# Altium footprint library AMDC.PcbLib: 96 footprints (part 1 of 6)
Each footprint in its own frame and in the unit in brackets; x right, y up, seen from the top. Pads: shape width x height; smd on the part's side, far side on the other; paste and mask are expansions set on the pad; w line width, h text height; cw(c..) or ccw(c..) is an arc to the next point about the centre after c.
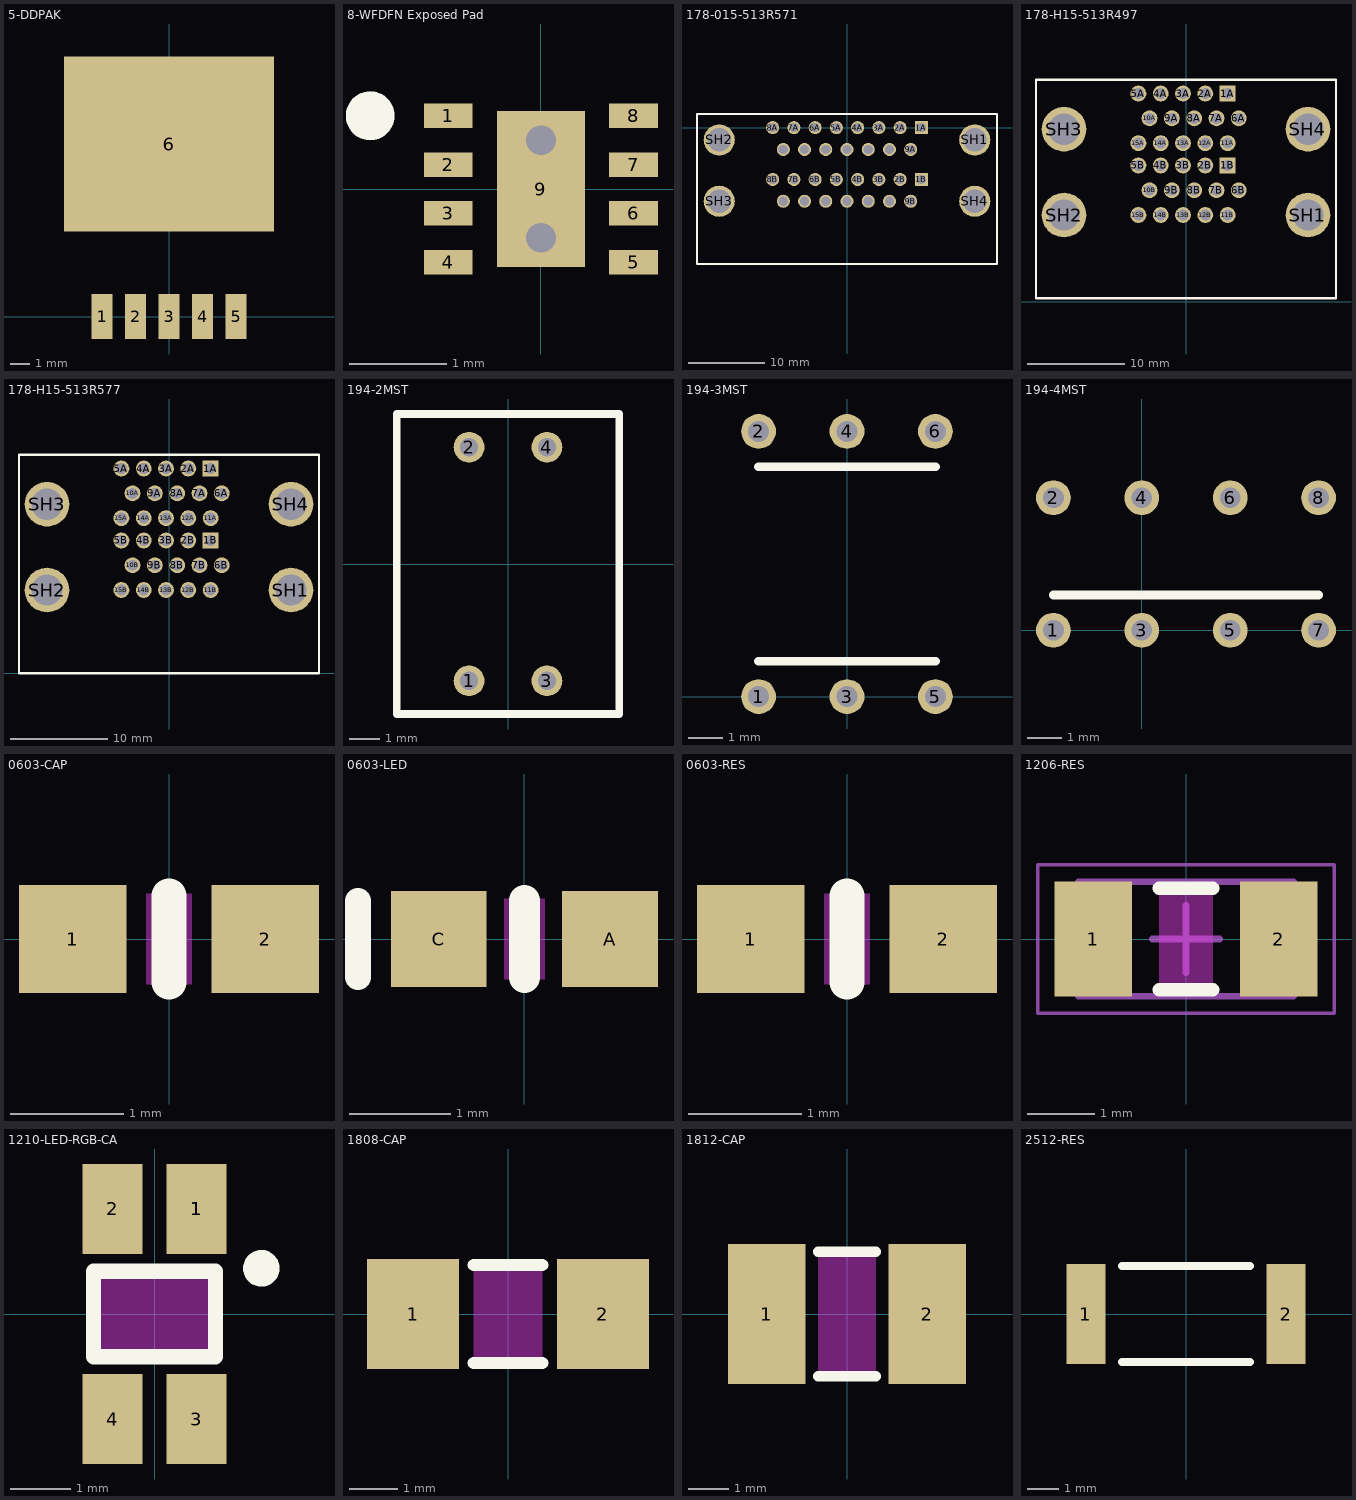
[diagram p0: the footprints below, top view; thin cyan lines are the x and y axes]

## 5-DDPAK [mil] "Q PACKAGE  5-LEAD PLASTIC DD"
height 7.09
pads (6):
  rect 42x90 smd: 1(-134,0) 2(-67,0) 3(0,0) 4(67,0) 5(134,0)
  rect 420x350 smd: 6(0,345)
3D body "TO-263-5.STEP": height 179.53, standoff 0, extent -200,-36.52 200,515.25

## 8-WFDFN Exposed Pad [mm] "8-WSON (2x2)"
pads (9):
  rect 0.5x0.25 smd: 1(-0.95,0.75) 2(-0.95,0.25) 3(-0.95,-0.25) 4(-0.95,-0.75) 5(0.95,-0.75) 6(0.95,-0.25) 7(0.95,0.25) 8(0.95,0.75)
  rect 0.9x1.6 smd: 9(0,0)
via 0,-0.5 diameter 0.559 hole 0.305
via 0,0.5 diameter 0.559 hole 0.305
Top Overlay:
  circle w0.25: c-1.75,0.75 r0.125

## 178-015-513R571 [mil] "CONN D-SUB RCPT 15POS R/A SLDR"
height 1250
pads (34):
  rect 67x67 hole 47: 1A(381.5,0) 1B(381.5,-266)
  round 67 hole 47: 2A(272.5,0) 2B(272.5,-266) 3A(163.5,0) 3B(163.5,-266) 4A(54.5,0) 4B(54.5,-266) 5A(-54.5,0) 5B(-54.5,-266) 6A(-163.5,0) 6B(-163.5,-266) 7A(-272.5,0) 7B(-272.5,-266) 8A(-381.5,0) 8B(-381.5,-266) 9A(327,-112) 9B(327,-378) 10A(218,-112) 10B(218,-378) 11A(109,-112) 11B(109,-378) 12A(0,-112) 12B(0,-378) 13A(-109,-112) 13B(-109,-378) 14A(-218,-112) 14B(-218,-378) 15A(-327,-112) 15B(-327,-378)
  round 160 hole 120: SH1(656,-63) SH2(-656,-63) SH3(-656,-378) SH4(656,-378)
Top Overlay:
  lines w10: -770,-700 770,-700 770,-63 770,30 770,70 -350,70 -500,70 -770,70 -770,-63 -770,-700
3D body "178-015-513.STEP": height 107.38, standoff -1268.62, extent -773.4,-938.49 774.6,62.51

## 178-H15-513R497 [mil] "CONN D-SUB RCPT/RCPT 15/15POS RA"
height 1244.09
pads (34):
  rect 64x64 hole 44: 1A(168,840) 1B(168,550)
  round 64 hole 44: 2A(78,840) 2B(78,550) 3A(-12,840) 3B(-12,550) 4A(-102,840) 4B(-102,550) 5A(-192,840) 5B(-192,550) 6A(213,740) 6B(213,450) 7A(123,740) 7B(123,450) 8A(33,740) 8B(33,450) 9A(-57,740) 9B(-57,450) 10A(-147,740) 10B(-147,450) 11A(168,640) 11B(168,350) 12A(78,640) 12B(78,350) 13A(-12,640) 13B(-12,350) 14A(-102,640) 14B(-102,350) 15A(-192,640) 15B(-192,350)
  round 180 hole 126: SH1(492,350) SH2(-492,350) SH3(-492,696.46) SH4(492,696.46)
Top Overlay:
  lines w10: -605,15 605,15 605,895 -605,895 -605,15
3D body "178-H15-513R497.STEP": height 1248.97, standoff -123.03, extent -608.5,-238 604.5,893

## 178-H15-513R577 [mil] "CONN D-SUB PLUG 15POS R/A SLDR"
height 1244.09
pads (34):
  rect 64x64 hole 44: 1A(168,825) 1B(168,535)
  round 64 hole 44: 2A(78,825) 2B(78,535) 3A(-12,825) 3B(-12,535) 4A(-102,825) 4B(-102,535) 5A(-192,825) 5B(-192,535) 6A(213,725) 6B(213,435) 7A(123,725) 7B(123,435) 8A(33,725) 8B(33,435) 9A(-57,725) 9B(-57,435) 10A(-147,725) 10B(-147,435) 11A(168,625) 11B(168,335) 12A(78,625) 12B(78,335) 13A(-12,625) 13B(-12,335) 14A(-102,625) 14B(-102,335) 15A(-192,625) 15B(-192,335)
  round 180 hole 126: SH1(492,335) SH2(-492,335) SH3(-492,681.46) SH4(492,681.46)
Top Overlay:
  lines w10: -605,0 -605,880 605,880 605,0 -605,0
3D body "178-H15-513R577.STEP": height 1247.05, standoff -142.66, extent -606.49,-244.09 606.5,889.77

## 194-2MST [mm] "SWITCH PIANO DIP SPST 50MA 24V"
pads (4):
  round 1 hole 0.6: 1(-1.27,-3.81) 2(-1.27,3.81) 3(1.27,-3.81) 4(1.27,3.81)
Top Overlay:
  lines w0.254: -1.27,4.89 3.63,4.89 3.63,-4.89 -3.63,-4.89 -3.63,4.89 0,4.89

## 194-3MST [mm] "SWITCH PIANO DIP SPST 50MA 24V"
pads (6):
  round 1 hole 0.6: 1(-2.54,0) 2(-2.54,7.62) 3(0,0) 4(0,7.62) 5(2.54,0) 6(2.54,7.62)
Top Overlay:
  lines w0.254: -2.54,1.016 2.54,1.016 ; -2.54,6.604 2.54,6.604

## 194-4MST [mm] "SWITCH PIANO DIP SPST 50MA 24V"
pads (8):
  round 1 hole 0.6: 1(-2.54,0) 2(-2.54,3.81) 3(0,0) 4(0,3.81) 5(2.54,0) 6(2.54,3.81) 7(5.08,0) 8(5.08,3.81)
Top Overlay:
  lines w0.254: -2.54,1.016 5.08,1.016

## 0603-CAP [mm]
pads (2):
  rect 0.95x0.95 smd: 1(-0.85,0) 2(0.85,0)
Top Layer keep-out:
  region: -0.2,0.4 0.2,0.4 0.2,-0.4 -0.2,-0.4
Top Overlay:
  lines w0.305: 0,-0.381 0,0.381
3D body "0603cap.step": height 0.79, standoff -0.01, extent -0.8,-0.4 0.8,0.4

## 0603-LED [mm]
pads (2):
  rect 0.95x0.95 smd: A(0.85,0) C(-0.85,0)
Top Layer keep-out:
  region: -0.2,0.4 0.2,0.4 0.2,-0.4 -0.2,-0.4
Top Overlay:
  lines w0.254: -1.651,-0.381 -1.651,0 -1.651,0.381
  lines w0.305: 0,-0.381 0,0 0,0.381
3D body "0603led.step": height 0.68, standoff 0, extent -0.833,-0.368 0.817,0.357
3D body: height 0.8, standoff -0.8, extent 0.051,0.813 0.051,0.813

## 0603-RES [mm]
pads (2):
  rect 0.95x0.95 smd: 1(-0.85,0) 2(0.85,0)
Top Layer keep-out:
  region: -0.2,0.4 0.2,0.4 0.2,-0.4 -0.2,-0.4
Top Overlay:
  lines w0.305: 0,-0.381 0,0.381
3D body "0603res.step": height 0.44, standoff -0.02, extent -0.8,-0.4 0.8,0.4

## 1206-RES [mm] "Chip Resistor, 2-Leads, Body 3.10x1.60mm, IPC Medium Density"
height 0.65
pads (2):
  rect 1.15x1.7 smd: 1(-1.375,0) 2(1.375,0)
Top Layer keep-out:
  region: -0.4,0.75 -0.4,-0.75 0.4,-0.75 0.4,0.75
Top Overlay:
  lines w0.2: -0.4,-0.75 0.4,-0.75 ; -0.4,0.75 0.4,0.75
Mechanical 13:
  lines w0.1: -1.6,-0.85 1.6,-0.85 1.6,0.85 -1.6,0.85 -1.6,-0.85
Mechanical 15:
  lines w0.05: -2.2,-1.1 2.2,-1.1 2.2,1.1 -2.2,1.1 -2.2,-1.1
  lines w0.1: -0.5,0 0.5,0 ; 0,-0.5 0,0.5
3D body "RESC3116X06N.step": height 0.65, standoff 0, extent -1.6,-0.85 1.6,0.85

## 1210-LED-RGB-CA [mm]
pads (5):
  rect 1x1.5 smd paste+0 mask+0: 1(0.7,1.75) 1(0.7,1.75) 2(-0.7,1.75) 3(0.7,-1.75) 4(-0.7,-1.75)
Top Layer keep-out:
  region: -1.016,0.711 1.016,0.711 1.016,-0.711 -1.016,-0.711
Top Overlay:
  circle w0.305: c1.778,0.762 r0.152
  lines w0.254: -1.016,-0.711 -1.016,0.711 1.016,0.711 1.016,-0.711 -1.016,-0.711

## 1808-CAP [mil]
pads (2):
  rect 75x90 smd: 1(-77.48,0) 2(77.48,0)
Top Layer keep-out:
  region: -28,40 28,40 28,-40 -28,-40
Top Overlay:
  lines w10: -28,-40 28,-40 ; -28,40 28,40

## 1812-CAP [mil]
pads (2):
  rect 75x135 smd: 1(-77.48,0) 2(77.48,0)
Top Layer keep-out:
  region: -28,60 28,60 28,-60 -28,-60
Top Overlay:
  lines w10: -28,-60 28,-60 ; -28,60 28,60

## 2512-RES [mil]
pads (2):
  rect 49x125 smd: 1(-125.51,0) 2(125.51,0)
Top Overlay:
  lines w10: -80,-60 80,-60 ; -80,60 80,60